# Altium footprint library PCBLIB.PcbLib: 775 footprints (part 1 of 49)
Each footprint in its own frame and in the unit in brackets; x right, y up, seen from the top. Pads: shape width x height; smd on the part's side, far side on the other; paste and mask are expansions set on the pad; w line width, h text height; cw(c..) or ccw(c..) is an arc to the next point about the centre after c.
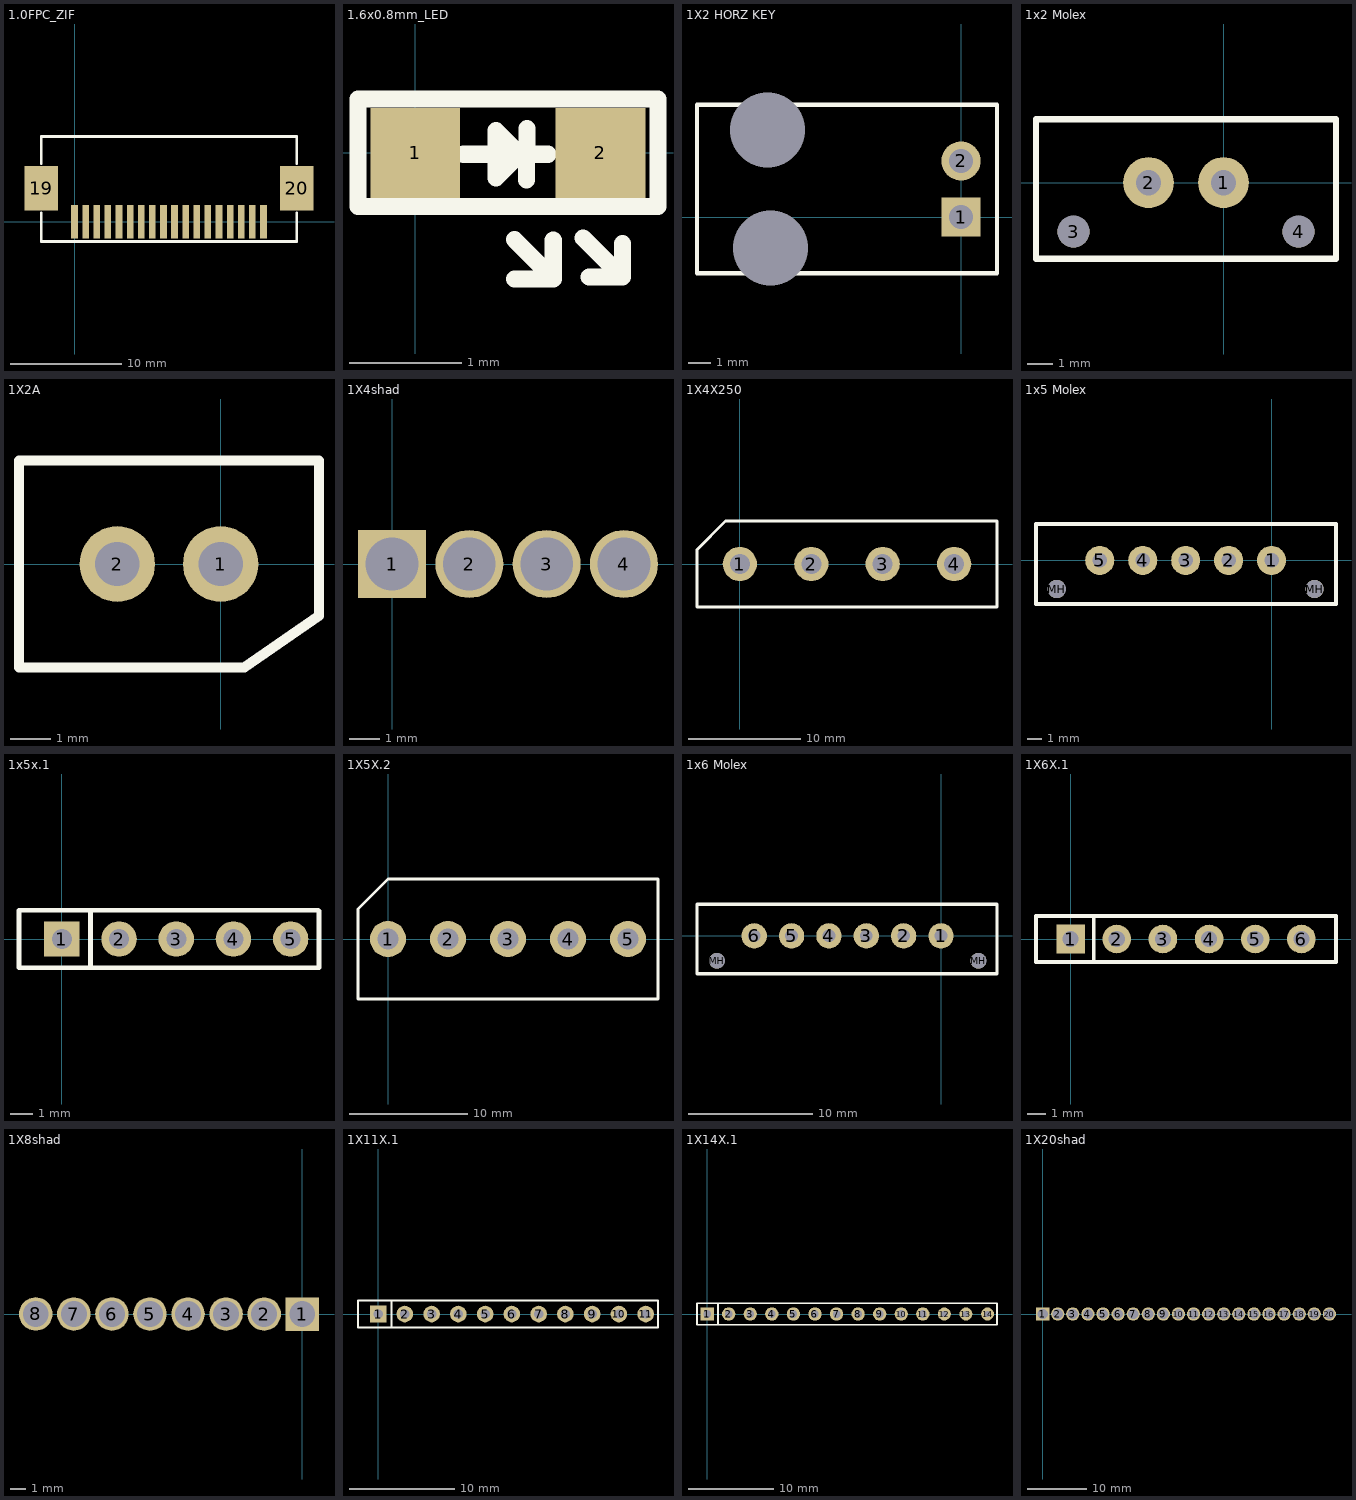
[diagram p0: the footprints below, top view; thin cyan lines are the x and y axes]

## 1.0FPC_ZIF [mm] "1.0 FPC Conn ZIF SMT (BOTTOM CONTACT)"
height 3
pads (20):
  rect 0.6x3 smd: 1(0,0) 2(1,0) 3(2,0) 4(3,0) 5(4,0) 6(5,0) 7(6,0) 8(7,0) 9(8,0) 10(9,0) 11(10,0) 12(11,0) 13(12,0) 14(13,0) 15(14,0) 16(15,0) 17(16,0) 18(17,0)
  rect 3x4 smd: 19(-3,3) 20(20,3)
TopOverlay:
  lines w0.254: -3,0.762 -3,-1.778 20,-1.778 20,0.762 ; -3,5.207 -3,7.65 20,7.65 20,5.207

## 1.6x0.8mm_LED [mm]
height 0.254
pads (2):
  rect 0.8x0.8 smd: 1(0,0) 2(1.65,0)
TopOverlay:
  lines w0.152: 0.43,-0.012 1.183,-0.012 ; 0.883,-1.125 1.229,-1.125 1.229,-0.779 ; 0.883,-0.773 1.229,-1.12 ; 0.991,-0.242 0.991,-0.012 ; 0.994,-0.012 0.994,0.218 ; 1.494,-0.757 1.842,-1.104 1.55,-1.104 ; 1.845,-1.104 1.845,-0.81 ; -0.511,-0.478 -0.511,0.482 2.163,0.482 2.163,-0.478 -0.511,-0.478 ; 0.717,-0.224 0.929,-0.012 0.717,0.2 0.717,-0.224

## 1X2 HORZ KEY [mil]
pads (4):
  rect 70x70 hole 43: 1(0,0)
  round 70 hole 43: 2(0,100)
  round 0 hole 134: MH(-345,155) MH(-340,-55)
TopOverlay:
  lines w8: -471,-100 -471,200 64,200 64,-100 -471,-100

## 1x2 Molex [mil]
height 390
pads (4):
  round 80 hole 40: 1(0,0) 2(-118,0)
  round 50 hole 50 unplated: 3(-236,-77) 4(118,-77)
TopOverlay:
  lines w10: -295,-120 177,-120 177,100 -295,100 -295,-120
  text "." at -3,116 h50
Mechanical4:
  text ".484" at 0,0 h1

## 1X2A [mil]
height 390
pads (2):
  round 73 hole 43: 1(0,0) 2(-100,0)
TopOverlay:
  lines w10: -195,-100 23,-100 95,-50 95,100 -195,100 -195,-100
  text "." at 80,-105 h50
Mechanical4:
  text ".484" at 0,0 h1

## 1X4shad [mil]
pads (4):
  rect 88x88 hole 68: 1(0,0)
  round 88 hole 68: 2(100,0) 3(200,0) 4(300,0)
Mechanical4:
  text ".400" at 0,0 h1
  text ".341" at 0,-0.23 h1

## 1X4X250 [mil]
pads (4):
  round 120 hole 70: 1(0,0) 2(250,0) 3(500,0) 4(750,0)
TopOverlay:
  lines w10: -150,-150 -150,50 -50,150 900,150 900,-150 -150,-150
  text "." at -130,111 h60
Mechanical4:
  text ".400" at 0,0 h1

## 1x5 Molex [mil]
height 390
pads (7):
  round 80 hole 40: 1(0,0) 2(-118.11,0) 3(-236.22,0) 4(-354.33,0) 5(-472.44,0)
  round 50 hole 50 unplated: MH(-590.55,-78.74) MH(118.11,-78.74)
TopOverlay:
  lines w10: -647.69,-120 -647.69,100 177,100 177,-120 -647.69,-120
  text "." at -3,116 h50
Mechanical4:
  text ".484" at 0,0 h1

## 1x5x.1 [mil]
height 390
pads (5):
  rect 62x62 hole 35: 1(0,0)
  round 62 hole 35: 2(100,0) 3(200,0) 4(300,0) 5(400,0)
TopOverlay:
  lines w8: 50,-50 50,50 ; -75,-50 -75,50 448.51,50 449.57,48.93 449.57,-50 -75,-50
Mechanical4:
  text ".358" at 0,0 h1

## 1X5X.2 [mil]
pads (5):
  round 120 hole 70: 1(0,0) 2(200,0) 3(400,0) 4(600,0) 5(800,0)
TopOverlay:
  lines w10: -100,-200 -100,100 0,200 900,200 900,-200 -100,-200
  text "." at -130,111 h60
Mechanical4:
  text ".400" at 0,0 h1

## 1x6 Molex [mil]
height 390
pads (8):
  round 80 hole 40: 1(0,0) 2(-118.11,0) 3(-236.22,0) 4(-354.33,0) 5(-472.44,0) 6(-590.55,0)
  round 50 hole 50 unplated: MH(-708.66,-78.74) MH(118.11,-78.74)
TopOverlay:
  lines w10: -771.42,-120 -771.42,100 177,100 177,-120 -771.42,-120
  text "." at -3,116 h50
Mechanical4:
  text ".484" at 0,0 h1

## 1X6X.1 [mil]
height 390
pads (6):
  rect 62x62 hole 35: 1(0,0)
  round 62 hole 35: 2(100,0) 3(200,0) 4(300,0) 5(400,0) 6(500,0)
TopOverlay:
  lines w8: 50,-50 50,50 ; -75,-50 575,-50 575,50 -75,50 -75,-50
Mechanical4:
  text ".358" at 0,0 h1

## 1X8shad [mil]
pads (8):
  rect 88x88 hole 68: 1(0,0)
  round 88 hole 68: 2(-100,0) 3(-200,0) 4(-300,0) 5(-400,0) 6(-500,0) 7(-600,0) 8(-700,0.23)
Mechanical4:
  text ".400" at -700,0.23 h1

## 1X11X.1 [mil]
height 390
pads (11):
  rect 62x62 hole 35: 1(0,0)
  round 62 hole 35: 2(100,0) 3(200,0) 4(300,0) 5(400,0) 6(500,0) 7(600,0) 8(700,0) 9(800,0) 10(900,0) 11(1000,0)
TopOverlay:
  lines w8: 50,-50 50,50 ; 1045.97,-49.79 1045.97,50.21 ; 1045.97,-49.24 1045.21,-50 -75,-50 -75,50 1045.4,50 1045.97,49.43
Mechanical4:
  text ".358" at 0,0 h1

## 1X14X.1 [mil]
height 390
pads (14):
  rect 62x62 hole 35: 1(0,0)
  round 62 hole 35: 2(100,0) 3(200,0) 4(300,0) 5(400,0) 6(500,0) 7(600,0) 8(700,0) 9(800,0) 10(900,0) 11(1000,0)
  round 60 hole 30: 12(1100,0) 13(1200,0) 14(1300,0)
TopOverlay:
  lines w8: 50,-50 50,50 ; -47,-50 1344,-50 1344,50 -47,50 -47,-50
Mechanical4:
  text ".358" at 0,0 h1

## 1X20shad [mil]
pads (20):
  rect 88x88 hole 68: 1(0,0)
  round 88 hole 68: 2(100,0) 3(200,0) 4(300,0) 5(400,0) 6(500,0) 7(600,0) 8(700,0) 9(800,0) 10(900,0) 11(1000,0) 12(1100,0) 13(1200,0) 14(1300,0) 15(1400,0) 16(1500,0) 17(1600,0) 18(1700,0) 19(1799.75,0) 20(1900,0)
Mechanical4:
  text ".400" at 0,0 h1